# Altium footprint library DIP Connector.PcbLib: 69 footprints (part 4 of 5) (continued)
## ГРПМШ1-61ШУ [mm] "61-контактная вилка для углового монтажа в отверстие печатной платы" (continued)
3D body: height 5.3, standoff 4.7, extent 11.95,6.201 12.547,6.799
3D body: height 2, standoff -2, extent 13.702,2.701 14.3,3.299
3D body: height 2.3, standoff 1.7, extent 13.7,2.701 14.297,3.299
3D body: height 2.3, standoff 1.7, extent 13.701,0 14.299,3
3D body: height 5.3, standoff 4.7, extent 15.451,0 16.049,6.5
3D body: height 5, standoff -2, extent 15.452,6.201 16.05,6.799
3D body: height 5.3, standoff 4.7, extent 15.45,6.201 16.047,6.799
3D body: height 2, standoff -2, extent 17.202,2.701 17.8,3.299
3D body: height 2.3, standoff 1.7, extent 17.2,2.701 17.797,3.299
3D body: height 2.3, standoff 1.7, extent 17.201,0 17.799,3
3D body: height 5.3, standoff 4.7, extent 18.951,0 19.549,6.5
3D body: height 5, standoff -2, extent 18.952,6.201 19.55,6.799
3D body: height 5.3, standoff 4.7, extent 18.95,6.201 19.547,6.799
3D body: height 2, standoff -2, extent 20.702,2.701 21.3,3.299
3D body: height 2.3, standoff 1.7, extent 20.7,2.701 21.297,3.299
3D body: height 2.3, standoff 1.7, extent 20.701,0 21.299,3
3D body: height 5.3, standoff 4.7, extent 22.451,0 23.049,6.5
3D body: height 5, standoff -2, extent 22.452,6.201 23.05,6.799
3D body: height 5.3, standoff 4.7, extent 22.45,6.201 23.047,6.799
3D body: height 2, standoff -2, extent 24.202,2.701 24.8,3.299
3D body: height 2.3, standoff 1.7, extent 24.2,2.701 24.797,3.299
3D body: height 2.3, standoff 1.7, extent 24.201,0 24.799,3
3D body: height 5.3, standoff 4.7, extent 25.951,0 26.549,6.5
3D body: height 5, standoff -2, extent 25.952,6.201 26.55,6.799
3D body: height 5.3, standoff 4.7, extent 25.95,6.201 26.547,6.799
3D body: height 2, standoff -2, extent 27.702,2.701 28.3,3.299
3D body: height 2.3, standoff 1.7, extent 27.7,2.701 28.297,3.299
3D body: height 2.3, standoff 1.7, extent 27.701,0 28.299,3
3D body: height 5.3, standoff 4.7, extent 29.451,0 30.049,6.5
3D body: height 5, standoff -2, extent 29.452,6.201 30.05,6.799
3D body: height 5.3, standoff 4.7, extent 29.45,6.201 30.047,6.799
3D body: height 2, standoff -2, extent 31.202,2.701 31.8,3.299
3D body: height 2.3, standoff 1.7, extent 31.2,2.701 31.797,3.299
3D body: height 2.3, standoff 1.7, extent 31.201,0 31.799,3
3D body: height 5.3, standoff 4.7, extent 32.951,0 33.549,6.5
3D body: height 5, standoff -2, extent 32.952,6.201 33.55,6.799
3D body: height 5.3, standoff 4.7, extent 32.95,6.201 33.547,6.799
3D body: height 2, standoff -2, extent 34.702,2.701 35.3,3.299
3D body: height 2.3, standoff 1.7, extent 34.7,2.701 35.297,3.299
3D body: height 2.3, standoff 1.7, extent 34.701,0 35.299,3
3D body: height 5.3, standoff 4.7, extent 36.451,0 37.049,6.5
3D body: height 5, standoff -2, extent 36.452,6.201 37.05,6.799
3D body: height 5.3, standoff 4.7, extent 36.45,6.201 37.047,6.799
3D body: height 2, standoff -2, extent 38.202,2.701 38.8,3.299
3D body: height 2.3, standoff 1.7, extent 38.2,2.701 38.797,3.299
3D body: height 2.3, standoff 1.7, extent 38.201,0 38.799,3
3D body: height 5.3, standoff 4.7, extent 39.951,0 40.549,6.5
3D body: height 5, standoff -2, extent 39.952,6.201 40.55,6.799
3D body: height 5.3, standoff 4.7, extent 39.95,6.201 40.547,6.799
3D body: height 2, standoff -2, extent 41.702,2.701 42.3,3.299
3D body: height 2.3, standoff 1.7, extent 41.7,2.701 42.297,3.299
3D body: height 2.3, standoff 1.7, extent 41.701,0 42.299,3
3D body: height 5.3, standoff 4.7, extent 43.451,0 44.049,6.5
3D body: height 5, standoff -2, extent 43.452,6.201 44.05,6.799
3D body: height 5.3, standoff 4.7, extent 43.45,6.201 44.047,6.799
3D body: height 2, standoff -2, extent 45.202,2.701 45.8,3.299
3D body: height 2.3, standoff 1.7, extent 45.2,2.701 45.797,3.299
3D body: height 2.3, standoff 1.7, extent 45.201,0 45.799,3
3D body: height 5.3, standoff 4.7, extent 46.951,0 47.549,6.5
3D body: height 5, standoff -2, extent 46.952,6.201 47.55,6.799
3D body: height 5.3, standoff 4.7, extent 46.95,6.201 47.547,6.799
3D body: height 2, standoff -2, extent 48.702,2.701 49.3,3.299
3D body: height 2.3, standoff 1.7, extent 48.7,2.701 49.297,3.299
3D body: height 2.3, standoff 1.7, extent 48.701,0 49.299,3
3D body: height 5.3, standoff 4.7, extent 50.451,0 51.049,6.5
3D body: height 5, standoff -2, extent 50.452,6.201 51.05,6.799
3D body: height 5.3, standoff 4.7, extent 50.45,6.201 51.047,6.799
3D body: height 2, standoff -2, extent 52.202,2.701 52.8,3.299
3D body: height 2.3, standoff 1.7, extent 52.2,2.701 52.797,3.299
3D body: height 2.3, standoff 1.7, extent 52.201,0 52.799,3

## СНП260-46ВП2x [mm]
pads (48):
  round 0.1 hole 2.7 unplated: 0(-62.5,0) 0(62.5,0)
  rect 1.3x1.3 hole 0.8: A1(55,-2.5) C1(55,2.5)
  round 1.3 hole 0.8: A3(50,-2.5) A5(45,-2.5) A7(40,-2.5) A9(35,-2.5) A11(30,-2.5) A13(25,-2.5) A15(20,-2.5) A17(15,-2.5) A19(10,-2.5) A21(5,-2.5) A23(0,-2.5) A25(-5,-2.5) A27(-10,-2.5) A29(-15,-2.5) A31(-20,-2.5) A33(-25,-2.5) A35(-30,-2.5) A37(-35,-2.5) A39(-40,-2.5) A41(-45,-2.5) A43(-50,-2.5) A45(-55,-2.5) C3(50,2.5) C5(45,2.5) C7(40,2.5) C9(35,2.5) C11(30,2.5) C13(25,2.5) C15(20,2.5) C17(15,2.5) C19(10,2.5) C21(5,2.5) C23(0,2.5) C25(-5,2.5) C27(-10,2.5) C29(-15,2.5) C31(-20,2.5) C33(-25,2.5) C35(-30,2.5) C37(-35,2.5) C39(-40,2.5) C41(-45,2.5) C43(-50,2.5) C45(-55,2.5)
Top Layer keep-out:
  circle w0.1: c-62.5,0 r1.35
  circle w0.1: c62.5,0 r1.35
Bottom Layer keep-out:
  circle w0.1: c-62.5,0 r1.35
  circle w0.1: c62.5,0 r1.35
Top Overlay:
  lines w0.25: -66,-2.5 -60,-2.5 -60,2.5 -66,2.5 ; -57.5,4 -53.5,4 -53.5,5 ; -29.5,5 -29.5,4 -25.5,4 -25.5,5 ; -2,5 -2,4 2,4 2,5 ; 25.5,5 25.5,4 29.5,4 29.5,5 ; 53.5,5 53.5,4 57.5,4 ; 66,-2.5 60,-2.5 60,2.5 66,2.5 ; -66,-6 -66,6 66,6 66,-6 -66,-6 ; -57.5,-5 -57.5,5 57.5,5 57.5,-5 -57.5,-5
Mechanical 15:
  lines w0.1: -2.5,0 2.5,0 ; 0,-2.5 0,2.5 ; -66,-6 -66,6 66,6 66,-6 -66,-6

## СНП260-46РП3x [mm]
pads (48):
  round 0.1 hole 2.7 unplated: 0(-62.5,5) 0(62.5,5)
  rect 1.3x1.3 hole 0.8: A1(-55,5) C1(-55,10)
  round 1.3 hole 0.8: A3(-50,5) A5(-45,5) A7(-40,5) A9(-35,5) A11(-30,5) A13(-25,5) A15(-20,5) A17(-15,5) A19(-10,5) A21(-5,5) A23(0,5) A25(5,5) A27(10,5) A29(15,5) A31(20,5) A33(25,5) A35(30,5) A37(35,5) A39(40,5) A41(45,5) A43(50,5) A45(55,5) C3(-50,10) C5(-45,10) C7(-40,10) C9(-35,10) C11(-30,10) C13(-25,10) C15(-20,10) C17(-15,10) C19(-10,10) C21(-5,10) C23(0,10) C25(5,10) C27(10,10) C29(15,10) C31(20,10) C33(25,10) C35(30,10) C37(35,10) C39(40,10) C41(45,10) C43(50,10) C45(55,10)
Top Layer keep-out:
  circle w0.1: c62.5,5 r1.35
  circle w0.1: c-62.5,5 r1.35
Bottom Layer keep-out:
  circle w0.1: c62.5,5 r1.35
  circle w0.1: c-62.5,5 r1.35
Top Overlay:
  lines w0.25: -57.5,0 -57.5,-8 -56.5,-9 56.5,-9 57.5,-8 57.5,0 ; -53.5,-9 -53.5,0 -66,0 -66,8 -57.5,8 -57.5,3.5 57.5,3.5 57.5,8 66,8 66,0 53.5,0 53.5,-9 ; -29.5,-9 -29.5,0 -25.5,0 -25.5,-9 ; -2,-9 -2,0 2,0 2,-9 ; 25.5,-9 25.5,0 29.5,0 29.5,-9
  text "35" at 29.5,11.25 h2
  text "25" at 4.5,11.25 h2
  text "15" at -20.5,11.25 h2
  text "5" at -45.25,11.25 h2
  text "45" at 54.25,11.25 h2
  text "1" at -55.25,11.25 h2
  text "C" at -57.5,9.5 h2
  text "A" at -57.5,4.5 h2
  text "A" at 56.25,4.5 h2
  text "C" at 56.25,9.5 h2
Bottom Overlay:
  text "35" at 30.5,11.25 h2
  text "25" at 5.5,11.25 h2
  text "15" at -19.5,11.25 h2
  text "5" at -44.75,11.25 h2
  text "1" at -54.75,11.25 h2
  text "45" at 55.5,11.25 h2
  text "A" at -56.25,4.5 h2
  text "C" at -56.25,9.5 h2
  text "C" at 57.5,9.5 h2
  text "A" at 57.5,4.5 h2
Mechanical 15:
  lines w0.1: -57.5,8 -57.5,12.5 57.5,12.5 57.5,8 66,8 66,0 -66,0 -66,8 -57.467,8 ; -2.5,7.5 2.5,7.5 ; 0,5 0,10

## СНП260-69ВП2x [mm]
pads (71):
  round 0.1 hole 2.7 unplated: 0(-62.5,0) 0(62.5,0)
  rect 1.3x1.3 hole 0.8: A1(55,-2.5) B1(55,0) C1(55,2.5)
  round 1.3 hole 0.8: A3(50,-2.5) A5(45,-2.5) A7(40,-2.5) A9(35,-2.5) A11(30,-2.5) A13(25,-2.5) A15(20,-2.5) A17(15,-2.5) A19(10,-2.5) A21(5,-2.5) A23(0,-2.5) A25(-5,-2.5) A27(-10,-2.5) A29(-15,-2.5) A31(-20,-2.5) A33(-25,-2.5) A35(-30,-2.5) A37(-35,-2.5) A39(-40,-2.5) A41(-45,-2.5) A43(-50,-2.5) A45(-55,-2.5) B3(50,0) B5(45,0) B7(40,0) B9(35,0) B11(30,0) B13(25,0) B15(20,0) B17(15,0) B19(10,0) B21(5,0) B23(0,0) B25(-5,0) B27(-10,0) B29(-15,0) B31(-20,0) B33(-25,0) B35(-30,0) B37(-35,0) B39(-40,0) B41(-45,0) B43(-50,0) B45(-55,0) C3(50,2.5) C5(45,2.5) C7(40,2.5) C9(35,2.5) C11(30,2.5) C13(25,2.5) C15(20,2.5) C17(15,2.5) C19(10,2.5) C21(5,2.5) C23(0,2.5) C25(-5,2.5) C27(-10,2.5) C29(-15,2.5) C31(-20,2.5) C33(-25,2.5) C35(-30,2.5) C37(-35,2.5) C39(-40,2.5) C41(-45,2.5) C43(-50,2.5) C45(-55,2.5)
Top Layer keep-out:
  circle w0.1: c-62.5,0 r1.35
  circle w0.1: c62.5,0 r1.35
Bottom Layer keep-out:
  circle w0.1: c-62.5,0 r1.35
  circle w0.1: c62.5,0 r1.35
Top Overlay:
  lines w0.25: -66,-2.5 -60,-2.5 -60,2.5 -66,2.5 ; -57.5,4 -53.5,4 -53.5,5 ; -29.5,5 -29.5,4 -25.5,4 -25.5,5 ; -2,5 -2,4 2,4 2,5 ; 25.5,5 25.5,4 29.5,4 29.5,5 ; 53.5,5 53.5,4 57.5,4 ; 66,-2.5 60,-2.5 60,2.5 66,2.5 ; -66,-6 -66,6 66,6 66,-6 -66,-6 ; -57.5,-5 -57.5,5 57.5,5 57.5,-5 -57.5,-5
Mechanical 15:
  lines w0.1: -2.5,0 2.5,0 ; 0,-2.5 0,2.5 ; -66,-6 -66,6 66,6 66,-6 -66,-6

## СНП260-69РП3x [mm]
pads (71):
  round 0.1 hole 2.7 unplated: 0(-62.5,5) 0(62.5,5)
  rect 1.3x1.3 hole 0.8: A1(-55,5) B1(-55,7.5) C1(-55,10)
  round 1.3 hole 0.8: A3(-50,5) A5(-45,5) A7(-40,5) A9(-35,5) A11(-30,5) A13(-25,5) A15(-20,5) A17(-15,5) A19(-10,5) A21(-5,5) A23(0,5) A25(5,5) A27(10,5) A29(15,5) A31(20,5) A33(25,5) A35(30,5) A37(35,5) A39(40,5) A41(45,5) A43(50,5) A45(55,5) B3(-50,7.5) B5(-45,7.5) B7(-40,7.5) B9(-35,7.5) B11(-30,7.5) B13(-25,7.5) B15(-20,7.5) B17(-15,7.5) B19(-10,7.5) B21(-5,7.5) B23(0,7.5) B25(5,7.5) B27(10,7.5) B29(15,7.5) B31(20,7.5) B33(25,7.5) B35(30,7.5) B37(35,7.5) B39(40,7.5) B41(45,7.5) B43(50,7.5) B45(55,7.5) C3(-50,10) C5(-45,10) C7(-40,10) C9(-35,10) C11(-30,10) C13(-25,10) C15(-20,10) C17(-15,10) C19(-10,10) C21(-5,10) C23(0,10) C25(5,10) C27(10,10) C29(15,10) C31(20,10) C33(25,10) C35(30,10) C37(35,10) C39(40,10) C41(45,10) C43(50,10) C45(55,10)
Top Layer keep-out:
  circle w0.1: c-62.5,5 r1.35
  circle w0.1: c62.5,5 r1.35
Bottom Layer keep-out:
  circle w0.1: c-62.5,5 r1.35
  circle w0.1: c62.5,5 r1.35
Top Overlay:
  lines w0.25: -57.5,0 -57.5,-8 -56.5,-9 56.5,-9 57.5,-8 57.5,0 ; -53.5,-9 -53.5,0 -66,0 -66,8 -57.5,8 -57.5,3.5 57.5,3.5 57.5,8 66,8 66,0 53.5,0 53.5,-9 ; -29.5,-9 -29.5,0 -25.5,0 -25.5,-9 ; -2,-9 -2,0 2,0 2,-9 ; 25.5,-9 25.5,0 29.5,0 29.5,-9
  text "C" at 56.25,9.5 h2
  text "B" at 56.25,7 h2
  text "A" at 56.25,4.5 h2
  text "A" at -57.5,4.5 h2
  text "B" at -57.5,7 h2
  text "C" at -57.5,9.5 h2
  text "1" at -55.25,11.25 h2
  text "45" at 54.25,11.25 h2
  text "5" at -45.25,11.25 h2
  text "15" at -20.5,11.25 h2
  text "25" at 4.5,11.25 h2
  text "35" at 29.5,11.25 h2
Bottom Overlay:
  text "A" at 57.5,4.5 h2
  text "B" at 57.5,7 h2
  text "C" at 57.5,9.5 h2
  text "C" at -56.25,9.5 h2
  text "B" at -56.25,7 h2
  text "A" at -56.25,4.5 h2
  text "45" at 55.5,11.25 h2
  text "1" at -54.75,11.25 h2
  text "5" at -44.75,11.25 h2
  text "15" at -19.5,11.25 h2
  text "25" at 5.5,11.25 h2
  text "35" at 30.5,11.25 h2
Mechanical 15:
  lines w0.1: -57.5,8 -57.5,12.5 57.5,12.5 57.5,8 66,8 66,0 -66,0 -66,8 -57.467,8 ; -2.5,7.5 2.5,7.5 ; 0,5 0,10

## СНП260-90ВП2x [mm]
pads (92):
  round 0.1 hole 2.7 unplated: 0(-62.5,0) 0(62.5,0)
  rect 1.3x1.3 hole 0.8: A1(55,-2.5) A10(32.5,-2.5) A20(7.5,-2.5) A30(-17.5,-2.5) A40(-42.5,-2.5) C1(55,2.5) C10(32.5,2.5) C20(7.5,2.5) C30(-17.5,2.5) C40(-42.5,2.5)
  round 1.3 hole 0.8: A2(52.5,-2.5) A3(50,-2.5) A4(47.5,-2.5) A5(45,-2.5) A6(42.5,-2.5) A7(40,-2.5) A8(37.5,-2.5) A9(35,-2.5) A11(30,-2.5) A12(27.5,-2.5) A13(25,-2.5) A14(22.5,-2.5) A15(20,-2.5) A16(17.5,-2.5) A17(15,-2.5) A18(12.5,-2.5) A19(10,-2.5) A21(5,-2.5) A22(2.5,-2.5) A23(0,-2.5) A24(-2.5,-2.5) A25(-5,-2.5) A26(-7.5,-2.5) A27(-10,-2.5) A28(-12.5,-2.5) A29(-15,-2.5) A31(-20,-2.5) A32(-22.5,-2.5) A33(-25,-2.5) A34(-27.5,-2.5) A35(-30,-2.5) A36(-32.5,-2.5) A37(-35,-2.5) A38(-37.5,-2.5) A39(-40,-2.5) A41(-45,-2.5) A42(-47.5,-2.5) A43(-50,-2.5) A44(-52.5,-2.5) A45(-55,-2.5) C2(52.5,2.5) C3(50,2.5) C4(47.5,2.5) C5(45,2.5) C6(42.5,2.5) C7(40,2.5) C8(37.5,2.5) C9(35,2.5) C11(30,2.5) C12(27.5,2.5) C13(25,2.5) C14(22.5,2.5) C15(20,2.5) C16(17.5,2.5) C17(15,2.5) C18(12.5,2.5) C19(10,2.5) C21(5,2.5) C22(2.5,2.5) C23(0,2.5) C24(-2.5,2.5) C25(-5,2.5) C26(-7.5,2.5) C27(-10,2.5) C28(-12.5,2.5) C29(-15,2.5) C31(-20,2.5) C32(-22.5,2.5) C33(-25,2.5) C34(-27.5,2.5) C35(-30,2.5) C36(-32.5,2.5) C37(-35,2.5) C38(-37.5,2.5) C39(-40,2.5) C41(-45,2.5) C42(-47.5,2.5) C43(-50,2.5) C44(-52.5,2.5) C45(-55,2.5)
Top Layer keep-out:
  circle w0.1: c-62.5,0 r1.35
  circle w0.1: c62.5,0 r1.35
Bottom Layer keep-out:
  circle w0.1: c-62.5,0 r1.35
  circle w0.1: c62.5,0 r1.35
Top Overlay:
  lines w0.25: -66,-2.5 -60,-2.5 -60,2.5 -66,2.5 ; -57.5,4 -53.5,4 -53.5,5 ; -29.5,5 -29.5,4 -25.5,4 -25.5,5 ; -2,5 -2,4 2,4 2,5 ; 25.5,5 25.5,4 29.5,4 29.5,5 ; 53.5,5 53.5,4 57.5,4 ; 66,-2.5 60,-2.5 60,2.5 66,2.5 ; -66,-6 -66,6 66,6 66,-6 -66,-6 ; -57.5,-5 -57.5,5 57.5,5 57.5,-5 -57.5,-5
Mechanical 15:
  lines w0.1: -2.5,0 2.5,0 ; 0,-2.5 0,2.5 ; -66,-6 -66,6 66,6 66,-6 -66,-6

## СНП260-90РП3x [mm]
pads (92):
  round 0.1 hole 2.7 unplated: 0(-62.5,5) 0(62.5,5)
  rect 1.3x1.3 hole 0.8: A1(-55,5) A10(-32.5,5) A20(-7.5,5) A30(17.5,5) A40(42.5,5) C1(-55,10) C10(-32.5,10) C20(-7.5,10) C30(17.5,10) C40(42.5,10)
  round 1.3 hole 0.8: A2(-52.5,5) A3(-50,5) A4(-47.5,5) A5(-45,5) A6(-42.5,5) A7(-40,5) A8(-37.5,5) A9(-35,5) A11(-30,5) A12(-27.5,5) A13(-25,5) A14(-22.5,5) A15(-20,5) A16(-17.5,5) A17(-15,5) A18(-12.5,5) A19(-10,5) A21(-5,5) A22(-2.5,5) A23(0,5) A24(2.5,5) A25(5,5) A26(7.5,5) A27(10,5) A28(12.5,5) A29(15,5) A31(20,5) A32(22.5,5) A33(25,5) A34(27.5,5) A35(30,5) A36(32.5,5) A37(35,5) A38(37.5,5) A39(40,5) A41(45,5) A42(47.5,5) A43(50,5) A44(52.5,5) A45(55,5) C2(-52.5,10) C3(-50,10) C4(-47.5,10) C5(-45,10) C6(-42.5,10) C7(-40,10) C8(-37.5,10) C9(-35,10) C11(-30,10) C12(-27.5,10) C13(-25,10) C14(-22.5,10) C15(-20,10) C16(-17.5,10) C17(-15,10) C18(-12.5,10) C19(-10,10) C21(-5,10) C22(-2.5,10) C23(0,10) C24(2.5,10) C25(5,10) C26(7.5,10) C27(10,10) C28(12.5,10) C29(15,10) C31(20,10) C32(22.5,10) C33(25,10) C34(27.5,10) C35(30,10) C36(32.5,10) C37(35,10) C38(37.5,10) C39(40,10) C41(45,10) C42(47.5,10) C43(50,10) C44(52.5,10) C45(55,10)
Top Layer keep-out:
  circle w0.1: c62.5,5 r1.35
  circle w0.1: c-62.5,5 r1.35
Bottom Layer keep-out:
  circle w0.1: c62.5,5 r1.35
  circle w0.1: c-62.5,5 r1.35
Top Overlay:
  lines w0.25: -57.5,0 -57.5,-8 -56.5,-9 56.5,-9 57.5,-8 57.5,0 ; -53.5,-9 -53.5,0 -66,0 -66,8 -57.5,8 -57.5,3.5 57.5,3.5 57.5,8 66,8 66,0 53.5,0 53.5,-9 ; -29.5,-9 -29.5,0 -25.5,0 -25.5,-9 ; -2,-9 -2,0 2,0 2,-9 ; 25.5,-9 25.5,0 29.5,0 29.5,-9
  text "C" at 56.25,9.5 h2
  text "A" at 56.25,4.5 h2
  text "A" at -57.5,4.5 h2
  text "C" at -57.5,9.5 h2
  text "1" at -55.25,11.25 h2
  text "10" at -33,11.25 h2
  text "20" at -8.25,11.25 h2
  text "30" at 16.75,11.25 h2
  text "40" at 41.75,11.25 h2
  text "45" at 54.25,11.25 h2
  text "5" at -45.25,11.25 h2
  text "15" at -20.5,11.25 h2
  text "25" at 4.5,11.25 h2
  text "35" at 29.5,11.25 h2
Bottom Overlay:
  text "A" at 57.5,4.5 h2
  text "C" at 57.5,9.5 h2
  text "C" at -56.25,9.5 h2
  text "A" at -56.25,4.5 h2
  text "45" at 55.5,11.25 h2
  text "40" at 43.25,11.25 h2
  text "30" at 18,11.25 h2
  text "20" at -7,11.25 h2
  text "10" at -32,11.25 h2
  text "1" at -54.75,11.25 h2
  text "5" at -44.75,11.25 h2
  text "15" at -19.5,11.25 h2
  text "25" at 5.5,11.25 h2
  text "35" at 30.5,11.25 h2
Mechanical 15:
  lines w0.1: -57.5,8 -57.5,12.5 57.5,12.5 57.5,8 66,8 66,0 -66,0 -66,8 -57.467,8 ; -2.5,7.5 2.5,7.5 ; 0,5 0,10

## СНП260-113РП3x [mm]
pads (115):
  round 0.1 hole 2.7 unplated: 0(-62.5,5) 0(62.5,5)
  rect 1.3x1.3 hole 0.8: A1(-55,5) A10(-32.5,5) A20(-7.5,5) A30(17.5,5) A40(42.5,5) B1(-55,7.5) C1(-55,10) C10(-32.5,10) C20(-7.5,10) C30(17.5,10) C40(42.5,10)
  round 1.3 hole 0.8: A2(-52.5,5) A3(-50,5) A4(-47.5,5) A5(-45,5) A6(-42.5,5) A7(-40,5) A8(-37.5,5) A9(-35,5) A11(-30,5) A12(-27.5,5) A13(-25,5) A14(-22.5,5) A15(-20,5) A16(-17.5,5) A17(-15,5) A18(-12.5,5) A19(-10,5) A21(-5,5) A22(-2.5,5) A23(0,5) A24(2.5,5) A25(5,5) A26(7.5,5) A27(10,5) A28(12.5,5) A29(15,5) A31(20,5) A32(22.5,5) A33(25,5) A34(27.5,5) A35(30,5) A36(32.5,5) A37(35,5) A38(37.5,5) A39(40,5) A41(45,5) A42(47.5,5) A43(50,5) A44(52.5,5) A45(55,5) B3(-50,7.5) B5(-45,7.5) B7(-40,7.5) B9(-35,7.5) B11(-30,7.5) B13(-25,7.5) B15(-20,7.5) B17(-15,7.5) B19(-10,7.5) B21(-5,7.5) B23(0,7.5) B25(5,7.5) B27(10,7.5) B29(15,7.5) B31(20,7.5) B33(25,7.5) B35(30,7.5) B37(35,7.5) B39(40,7.5) B41(45,7.5) B43(50,7.5) B45(55,7.5) C2(-52.5,10) C3(-50,10) C4(-47.5,10) C5(-45,10) C6(-42.5,10) C7(-40,10) C8(-37.5,10) C9(-35,10) C11(-30,10) C12(-27.5,10) C13(-25,10) C14(-22.5,10) C15(-20,10) C16(-17.5,10) C17(-15,10) C18(-12.5,10) C19(-10,10) C21(-5,10) C22(-2.5,10) C23(0,10) C24(2.5,10) C25(5,10) C26(7.5,10) C27(10,10) C28(12.5,10) C29(15,10) C31(20,10) C32(22.5,10) C33(25,10) C34(27.5,10) C35(30,10) C36(32.5,10) C37(35,10) C38(37.5,10) C39(40,10) C41(45,10) C42(47.5,10) C43(50,10) C44(52.5,10) C45(55,10)
Top Layer keep-out:
  circle w0.1: c62.5,5 r1.35
  circle w0.1: c-62.5,5 r1.35
Bottom Layer keep-out:
  circle w0.1: c62.5,5 r1.35
  circle w0.1: c-62.5,5 r1.35
Top Overlay:
  lines w0.25: -57.5,0 -57.5,-8 -56.5,-9 56.5,-9 57.5,-8 57.5,0 ; -53.5,-9 -53.5,0 -66,0 -66,8 -57.5,8 -57.5,3.5 57.5,3.5 57.5,8 66,8 66,0 53.5,0 53.5,-9 ; -29.5,-9 -29.5,0 -25.5,0 -25.5,-9 ; -2,-9 -2,0 2,0 2,-9 ; 25.5,-9 25.5,0 29.5,0 29.5,-9
  text "35" at 29.5,11.25 h2
  text "25" at 4.5,11.25 h2
  text "15" at -20.5,11.25 h2
  text "5" at -45.25,11.25 h2
  text "45" at 54.25,11.25 h2
  text "40" at 41.75,11.25 h2
  text "30" at 16.75,11.25 h2
  text "20" at -8.25,11.25 h2
  text "10" at -33,11.25 h2
  text "1" at -55.25,11.25 h2
  text "C" at -57.5,9.5 h2
  text "B" at -57.5,7 h2
  text "A" at -57.5,4.5 h2
  text "A" at 56.25,4.5 h2
  text "B" at 56.25,7 h2
  text "C" at 56.25,9.5 h2
Bottom Overlay:
  text "35" at 30.5,11.25 h2
  text "25" at 5.5,11.25 h2
  text "15" at -19.5,11.25 h2
  text "5" at -44.75,11.25 h2
  text "1" at -54.75,11.25 h2
  text "10" at -32,11.25 h2
  text "20" at -7,11.25 h2
  text "30" at 18,11.25 h2
  text "40" at 43.25,11.25 h2
  text "45" at 55.5,11.25 h2
  text "A" at -56.25,4.5 h2
  text "B" at -56.25,7 h2
  text "C" at -56.25,9.5 h2
  text "C" at 57.5,9.5 h2
  text "B" at 57.5,7 h2
  text "A" at 57.5,4.5 h2
Mechanical 15:
  lines w0.1: -57.5,8 -57.5,12.5 57.5,12.5 57.5,8 66,8 66,0 -66,0 -66,8 -57.467,8 ; -2.5,7.5 2.5,7.5 ; 0,5 0,10 0,5

## СНП260-135ВП2x [mm]
pads (137):
  round 0.1 hole 2.7 unplated: 0(-62.5,0) 0(62.5,0)
  rect 1.3x1.3 hole 0.8: A1(-55,2.5) A10(-32.5,2.5) A20(-7.5,2.5) A30(17.5,2.5) A40(42.5,2.5) B1(-55,0) B10(-32.5,0) B20(-7.5,0) B30(17.5,0) B40(42.5,0) C1(-55,-2.5) C10(-32.5,-2.5) C20(-7.5,-2.5) C30(17.5,-2.5) C40(42.5,-2.5)
  round 1.3 hole 0.8: A2(-52.5,2.5) A3(-50,2.5) A4(-47.5,2.5) A5(-45,2.5) A6(-42.5,2.5) A7(-40,2.5) A8(-37.5,2.5) A9(-35,2.5) A11(-30,2.5) A12(-27.5,2.5) A13(-25,2.5) A14(-22.5,2.5) A15(-20,2.5) A16(-17.5,2.5) A17(-15,2.5) A18(-12.5,2.5) A19(-10,2.5) A21(-5,2.5) A22(-2.5,2.5) A23(0,2.5) A24(2.5,2.5) A25(5,2.5) A26(7.5,2.5) A27(10,2.5) A28(12.5,2.5) A29(15,2.5) A31(20,2.5) A32(22.5,2.5) A33(25,2.5) A34(27.5,2.5) A35(30,2.5) A36(32.5,2.5) A37(35,2.5) A38(37.5,2.5) A39(40,2.5) A41(45,2.5) A42(47.5,2.5) A43(50,2.5) A44(52.5,2.5) A45(55,2.5) B2(-52.5,0) B3(-50,0) B4(-47.5,0) B5(-45,0) B6(-42.5,0) B7(-40,0) B8(-37.5,0) B9(-35,0) B11(-30,0) B12(-27.5,0) B13(-25,0) B14(-22.5,0) B15(-20,0) B16(-17.5,0) B17(-15,0) B18(-12.5,0) B19(-10,0) B21(-5,0) B22(-2.5,0) B23(0,0) B24(2.5,0) B25(5,0) B26(7.5,0) B27(10,0) B28(12.5,0) B29(15,0) B31(20,0) B32(22.5,0) B33(25,0) B34(27.5,0) B35(30,0) B36(32.5,0) B37(35,0) B38(37.5,0) B39(40,0) B41(45,0) B42(47.5,0) B43(50,0) B44(52.5,0) B45(55,0) C2(-52.5,-2.5) C3(-50,-2.5) C4(-47.5,-2.5) C5(-45,-2.5) C6(-42.5,-2.5) C7(-40,-2.5) C8(-37.5,-2.5) C9(-35,-2.5) C11(-30,-2.5) C12(-27.5,-2.5) C13(-25,-2.5) C14(-22.5,-2.5) C15(-20,-2.5) C16(-17.5,-2.5) C17(-15,-2.5) C18(-12.5,-2.5) C19(-10,-2.5) C21(-5,-2.5) C22(-2.5,-2.5) C23(0,-2.5) C24(2.5,-2.5) C25(5,-2.5) C26(7.5,-2.5) C27(10,-2.5) C28(12.5,-2.5) C29(15,-2.5) C31(20,-2.5) C32(22.5,-2.5) C33(25,-2.5) C34(27.5,-2.5) C35(30,-2.5) C36(32.5,-2.5) C37(35,-2.5) C38(37.5,-2.5) C39(40,-2.5) C41(45,-2.5) C42(47.5,-2.5) C43(50,-2.5) C44(52.5,-2.5) C45(55,-2.5)
Top Layer keep-out:
  circle w0.1: c62.5,0 r1.35
  circle w0.1: c-62.5,0 r1.35
Bottom Layer keep-out:
  circle w0.1: c62.5,0 r1.35
  circle w0.1: c-62.5,0 r1.35
Top Overlay:
  lines w0.25: -66,-2.5 -60,-2.5 -60,2.5 -66,2.5 ; -57.5,-4 -56,-4 ; -54,-4 -53.5,-4 -53.5,-5 ; -29.5,-5 -29.5,-4 -25.5,-4 -25.5,-5 ; -2,-5 -2,-4 2,-4 2,-5 ; 25.5,-5 25.5,-4 28.75,-4 ; 53.5,-5 53.5,-4 54,-4 ; 56,-4 57.5,-4 ; 66,-2.5 60,-2.5 60,2.5 66,2.5 ; -66,-6 66,-6 66,6 -66,6 -66,-6 ; -57.5,-5 -57.5,5 57.5,5 57.5,-5 -57.5,-5
  text "35" at 29.5,-4.65 h2
  text "25" at 4.5,-4.65 h2
  text "15" at -20.5,-4.65 h2
  text "5" at -45.25,-4.65 h2
  text "45" at 54.25,-4.65 h2
  text "40" at 41.75,-4.65 h2
  text "30" at 16.75,-4.65 h2
  text "20" at -8.25,-4.65 h2
  text "10" at -33,-4.65 h2
  text "1" at -55.25,-4.65 h2
  text "A" at 56.25,2 h2
  text "B" at 56.25,-0.5 h2
  text "C" at 56.25,-3 h2
  text "C" at -57.5,-3 h2
  text "B" at -57.5,-0.5 h2
  text "A" at -57.5,2 h2
  text "1" at -55.25,3.75 h2
  text "10" at -33,3.75 h2
  text "20" at -8.25,3.75 h2
  text "30" at 16.75,3.75 h2
  text "40" at 41.75,3.75 h2
  text "45" at 54.25,3.75 h2
  text "5" at -45.25,3.75 h2
  text "15" at -20.5,3.75 h2
  text "25" at 4.5,3.75 h2
  text "35" at 29.5,3.75 h2
Bottom Overlay:
  text "35" at 30.5,-4.65 h2
  text "25" at 5.75,-4.65 h2
  text "15" at -19.5,-4.65 h2
  text "5" at -44.75,-4.65 h2
  text "1" at -54.75,-4.65 h2
  text "10" at -32,-4.65 h2
  text "20" at -7,-4.65 h2
  text "30" at 18,-4.65 h2
  text "40" at 43.25,-4.65 h2
  text "45" at 55.5,-4.65 h2
  text "C" at 57.5,-3 h2
  text "B" at 57.5,-0.5 h2
  text "A" at 57.5,2 h2
  text "A" at -56.25,2 h2
  text "B" at -56.25,-0.5 h2
  text "C" at -56.25,-3 h2
  text "45" at 55.5,3.75 h2
  text "40" at 43.25,3.75 h2
  text "30" at 18,3.75 h2
  text "20" at -7,3.75 h2
  text "10" at -32,3.75 h2
  text "1" at -54.75,3.75 h2
  text "5" at -44.75,3.75 h2
  text "15" at -19.5,3.75 h2
  text "25" at 5.75,3.75 h2
  text "35" at 30.5,3.75 h2
Mechanical 15:
  lines w0.1: -2.5,0 2.5,0 ; 0,-2.5 0,2.5 ; -66,-6 66,-6 66,6 -66,6 -66,-6

## СНП260-135ВП3x [mm]
pads (137):
  round 0.1 hole 2.7 unplated: 0(-62.5,5) 0(62.5,5)
  rect 1.3x1.3 hole 0.8: A1(-55,5) A10(-32.5,5) A20(-7.5,5) A30(17.5,5) A40(42.5,5) B1(-55,7.5) B10(-32.5,7.5) B20(-7.5,7.5) B30(17.5,7.5) B40(42.5,7.5) C1(-55,10) C10(-32.5,10) C20(-7.5,10) C30(17.5,10) C40(42.5,10)
  round 1.3 hole 0.8: A2(-52.5,5) A3(-50,5) A4(-47.5,5) A5(-45,5) A6(-42.5,5) A7(-40,5) A8(-37.5,5) A9(-35,5) A11(-30,5) A12(-27.5,5) A13(-25,5) A14(-22.5,5) A15(-20,5) A16(-17.5,5) A17(-15,5) A18(-12.5,5) A19(-10,5) A21(-5,5) A22(-2.5,5) A23(0,5) A24(2.5,5) A25(5,5) A26(7.5,5) A27(10,5) A28(12.5,5) A29(15,5) A31(20,5) A32(22.5,5) A33(25,5) A34(27.5,5) A35(30,5) A36(32.5,5) A37(35,5) A38(37.5,5) A39(40,5) A41(45,5) A42(47.5,5) A43(50,5) A44(52.5,5) A45(55,5) B2(-52.5,7.5) B3(-50,7.5) B4(-47.5,7.5) B5(-45,7.5) B6(-42.5,7.5) B7(-40,7.5) B8(-37.5,7.5) B9(-35,7.5) B11(-30,7.5) B12(-27.5,7.5) B13(-25,7.5) B14(-22.5,7.5) B15(-20,7.5) B16(-17.5,7.5) B17(-15,7.5) B18(-12.5,7.5) B19(-10,7.5) B21(-5,7.5) B22(-2.5,7.5) B23(0,7.5) B24(2.5,7.5) B25(5,7.5) B26(7.5,7.5) B27(10,7.5) B28(12.5,7.5) B29(15,7.5) B31(20,7.5) B32(22.5,7.5) B33(25,7.5) B34(27.5,7.5) B35(30,7.5) B36(32.5,7.5) B37(35,7.5) B38(37.5,7.5) B39(40,7.5) B41(45,7.5) B42(47.5,7.5) B43(50,7.5) B44(52.5,7.5) B45(55,7.5) C2(-52.5,10) C3(-50,10) C4(-47.5,10) C5(-45,10) C6(-42.5,10) C7(-40,10) C8(-37.5,10) C9(-35,10) C11(-30,10) C12(-27.5,10) C13(-25,10) C14(-22.5,10) C15(-20,10) C16(-17.5,10) C17(-15,10) C18(-12.5,10) C19(-10,10) C21(-5,10) C22(-2.5,10) C23(0,10) C24(2.5,10) C25(5,10) C26(7.5,10) C27(10,10) C28(12.5,10) C29(15,10) C31(20,10) C32(22.5,10) C33(25,10) C34(27.5,10) C35(30,10) C36(32.5,10) C37(35,10) C38(37.5,10) C39(40,10) C41(45,10) C42(47.5,10) C43(50,10) C44(52.5,10) C45(55,10)
Top Layer keep-out:
  circle w0.1: c-62.5,5 r1.35
  circle w0.1: c62.5,5 r1.35
Bottom Layer keep-out:
  circle w0.1: c-62.5,5 r1.35
  circle w0.1: c62.5,5 r1.35
Top Overlay:
  lines w0.25: -66,0.25 66,0.25 66,8 57.5,8 57.5,3.5 -57.5,3.5 -57.5,8 -66,8 -66,0.25
  text "35" at 29.5,11.25 h2
  text "25" at 4.5,11.25 h2
  text "15" at -20.5,11.25 h2
  text "5" at -45.25,11.25 h2
  text "45" at 54.25,11.25 h2
  text "40" at 41.75,11.25 h2
  text "30" at 16.75,11.25 h2
  text "20" at -8.25,11.25 h2
  text "10" at -33,11.25 h2
  text "1" at -55.25,11.25 h2
  text "C" at -57.5,9.5 h2
  text "B" at -57.5,7 h2
  text "A" at -57.5,4.5 h2
  text "A" at 56.25,4.5 h2
  text "B" at 56.25,7 h2
  text "C" at 56.25,9.5 h2
Bottom Overlay:
  text "35" at 30.5,11.25 h2
  text "25" at 5.5,11.25 h2
  text "15" at -19.5,11.25 h2
  text "5" at -44.75,11.25 h2
  text "1" at -54.75,11.25 h2
  text "10" at -32,11.25 h2
  text "20" at -7,11.25 h2
  text "30" at 18,11.25 h2
  text "40" at 43.25,11.25 h2
  text "45" at 55.5,11.25 h2
  text "A" at -56.25,4.5 h2
  text "B" at -56.25,7 h2
  text "C" at -56.25,9.5 h2
  text "C" at 57.5,9.5 h2
  text "B" at 57.5,7 h2
  text "A" at 57.5,4.5 h2
Mechanical 15:
  lines w0.1: -57.5,8 -57.5,12.5 57.5,12.5 57.5,8 66,8 66,0 -66,0 -66,8 -57.467,8 ; -2.5,7.5 2.5,7.5 ; 0,5 0,10

## СНП268-9ВП2x-1 [mm] "Прямая вилка, 2,84mm между контактами"
height 20
pads (11):
  round 0.1 hole 3.2 unplated: 0(-12.5,0) 0(12.5,0)
  rect 1.8x1.8 hole 1: 1(-5.5,1.43)
  round 1.8 hole 1: 2(-2.75,1.43) 3(0,1.43) 4(2.75,1.43) 5(5.5,1.43) 6(-4.12,-1.41) 7(-1.37,-1.41) 8(1.38,-1.41) 9(4.13,-1.41)
Top Layer keep-out:
  circle w0.1: c12.5,0 r1.6
  circle w0.1: c-12.5,0 r1.6
Bottom Layer keep-out:
  circle w0.1: c12.5,0 r1.6
  circle w0.1: c-12.5,0 r1.6
Top Overlay:
  lines w0.25: -16,-5.5 -16,5.5 ; -15,-6.5 15,-6.5 ; -15,6.5 15,6.5 ; 16,-5.5 16,5.5
  lines w0.254: -16,-5.5 ccw(c-15,-5.5) -15,-6.5 ; -16,5.5 cw(c-15,5.5) -15,6.5 ; 15,-6.5 ccw(c15,-5.5) 16,-5.5 ; 15,6.5 cw(c15,5.5) 16,5.5
  text "1" at -6,3 h3
  text "5" at 5,3 h3
  text "6" at -4.5,-4.5 h3
  text "9" at 3.5,-4.5 h3
Bottom Overlay:
  text "1" at -5,3 h3
  text "5" at 6,3 h3
  text "6" at -3.5,-4.5 h3
  text "9" at 4.5,-4.5 h3
Mechanical 15:
  lines w0.1: -1.5,0 1.5,0 ; 0,-1.5 0,1.5 ; -16,-6.5 16,-6.5 16,6.5 -16,6.5 -16,-6.5
3D body "connector_a-ds_09_pp_z.stp": height 14.3, standoff -2.9, extent -15.405,-6.275 15.405,6.275